# Altium integrated library Integrated_Library - 02.02.25 - 22.49.IntLib: 792 symbols (part 6 of 11) (continued)
## CMP-009-00188-1
designator R?, comment ERJ-2GEJ681X  value 680  Mounting Technology: Surface Mount  Min Operating Temperature: -55°C  Case/Package: 0402  Tolerance: 5%  Pins: 2  Packaging: Tape and Reel  Power: 100mW  Max Operating Temperature: 155°C  RoHS Compliant: Yes
Fixed Resistor, Metal Glaze/thick Film, 0.1W, 680ohm, 50V, 5% +/-Tol, 200ppm/Cel, Surface Mount, 0402; Package Length: 1mm; Temperature Coefficient (ppm/Cel): 200; Reference Standard: AEC-Q200; Package Height: 0.35mm; Rated Temperature: 70°C; Package Width: 0.5mm; Terminal Finish: Nickel; Resistor Type: FIXED RESISTOR; Working Voltage: 50V; Construction: Rectangular; Termination: Wraparound; JESD-609 Code: e3; Package Shape: Rectangular; Reach SVHC Compliant: Yes; Technology: METAL GLAZE/THICK FILM
footprint RESC0805(2012)_L (Chip Resistor, Body 2.0x1.3mm, IPC High Density)
footprint RESC1005X40X25LL05T05 (Chip Resistor, 2-Leads, Body 1.00x0.50mm, IPC High Density)
footprint RESC1005X40X25NL05T05 (Chip Resistor, 2-Leads, Body 1.00x0.50mm, IPC Medium Density)
footprint RESC1005X40X25ML05T05 (Chip Resistor, 2-Leads, Body 1.00x0.50mm, IPC Low Density)
pins: 1, 2
1 alternate drawing of the same symbol

## CMP-009-00189-1
designator R?, comment ERJ-2RKF1002X  value 10k  Power: 100mW  Max Operating Temperature: 155°C  RoHS Compliant: Yes  Case/Package: 0402  Tolerance: 1%  Pins: 2  Packaging: Tape and Reel  Mounting Technology: Surface Mount  Min Operating Temperature: -55°C
Fixed Resistor, Metal Glaze/thick Film, 0.1W, 10000ohm, 50V, 1% +/-Tol, 100ppm/Cel, Surface Mount, 0402; Rated Temperature: 70°C; Reference Standard: AEC-Q200; Package Height: 0.35mm; Temperature Coefficient (ppm/Cel): 100; Package Width: 0.5mm; Package Length: 1mm; Resistor Type: FIXED RESISTOR; Terminal Finish: Nickel; Termination: Wraparound; JESD-609 Code: e3; Package Shape: Rectangular; Working Voltage: 50V; Technology: METAL GLAZE/THICK FILM; Construction: Rectangular; Reach SVHC Compliant: Yes
footprint RESC0805(2012)_L (Chip Resistor, Body 2.0x1.3mm, IPC High Density)
footprint RESC1005X40X25ML05T05-6 (Chip Resistor, 2-Leads, Body 1.05x0.55mm, IPC Low Density)
footprint RESC1005X40X25LL05T05-7 (Chip Resistor, 2-Leads, Body 1.05x0.55mm, IPC High Density)
footprint RESC1005X40X25NL05T05-8 (Chip Resistor, 2-Leads, Body 1.05x0.55mm, IPC Medium Density)
pins: 1, 2
1 alternate drawing of the same symbol

## CMP-009-00190-2
designator R?, comment ERJ-1GN0R00C  value 0  Case/Package: 0201  Min Operating Temperature: -55°C  RoHS Compliant: Yes  Mounting Technology: Surface Mount  Voltage Rating: 25V  Max Operating Temperature: 125°C  Tolerance: 1%
Zero Ohm Resistor, Jumper, 0201 [0603 Metric], Thick Film, 50 mW, 500 mA, Surface Mount; Case Code (Imperial): 0201; Contact Plating: Tin; Case Code (Metric): 0603
footprint FP-ERJ1GN-IPC_B
pins: 1, 2

## CMP-009-00191-1
designator R?, comment ERJ-2GEJ512X  value 5.1k  Packaging: Tape and Reel  Tolerance: 5%  Pins: 2  Mounting Technology: Surface Mount  Power: 100mW  Min Operating Temperature: -55°C  RoHS Compliant: Yes  Max Operating Temperature: 155°C  Case/Package: 0402
Fixed Resistor, Metal Glaze/thick Film, 0.1W, 5100ohm, 50V, 5% +/-Tol, 200ppm/Cel, Surface Mount, 0402; Reference Standard: AEC-Q200; Rated Temperature: 70°C; Temperature Coefficient (ppm/Cel): 200; Package Width: 0.5mm; Package Length: 1mm; Package Height: 0.35mm; Technology: METAL GLAZE/THICK FILM; Resistor Type: FIXED RESISTOR; Working Voltage: 50V; Package Shape: Rectangular; Construction: Rectangular; JESD-609 Code: e3; Terminal Finish: Nickel; Termination: Wraparound; Reach SVHC Compliant: Yes
footprint RESC0805(2012)_L (Chip Resistor, Body 2.0x1.3mm, IPC High Density)
footprint RESC1005X40X25LL05T05-34 (Chip Resistor, 2-Leads, Body 1.00x0.50mm, IPC High Density)
footprint RESC1005X40X25NL05T05-36 (Chip Resistor, 2-Leads, Body 1.00x0.50mm, IPC Medium Density)
footprint RESC1005X40X25ML05T05-35 (Chip Resistor, 2-Leads, Body 1.00x0.50mm, IPC Low Density)
pins: 1, 2
1 alternate drawing of the same symbol

## CMP-009-00192-1
designator R?, comment ERJ-2GEJ101X  value 100  Min Operating Temperature: -55°C  Packaging: Tape and Reel  Case/Package: 0402  Tolerance: 5%  Mounting Technology: Surface Mount  Max Operating Temperature: 155°C  Pins: 2  Power: 100mW  RoHS Compliant: Yes
Fixed Resistor, Metal Glaze/thick Film, 0.1W, 100ohm, 50V, 5% +/-Tol, 200ppm/Cel, Surface Mount, 0402; Package Width: 0.5mm; Rated Temperature: 70°C; Package Height: 0.35mm; Temperature Coefficient (ppm/Cel): 200; Package Length: 1mm; Reference Standard: AEC-Q200; JESD-609 Code: e3; Working Voltage: 50V; Technology: METAL GLAZE/THICK FILM; Construction: Rectangular; Terminal Finish: Nickel; Resistor Type: FIXED RESISTOR; Termination: Wraparound; Package Shape: Rectangular; Reach SVHC Compliant: Yes
footprint RESC0805(2012)_L (Chip Resistor, Body 2.0x1.3mm, IPC High Density)
footprint RESC1005X40X25LL05T05-18 (Chip Resistor, 2-Leads, Body 1.00x0.50mm, IPC High Density)
footprint RESC1005X40X25ML05T05-19 (Chip Resistor, 2-Leads, Body 1.00x0.50mm, IPC Low Density)
footprint RESC1005X40X25NL05T05-20 (Chip Resistor, 2-Leads, Body 1.00x0.50mm, IPC Medium Density)
pins: 1, 2
1 alternate drawing of the same symbol

## CMP-009-00193-1
designator R?, comment ERA-2AEB103X  value 10k  Packaging: Tape and Reel  Power: 63mW  Min Operating Temperature: -55°C  Mounting Technology: Surface Mount  Case/Package: 0402  Tolerance: 0.1%  Pins: 2  RoHS Compliant: Yes  Max Operating Temperature: 155°C
Fixed Resistor, Thin Film, 0.063W, 10000ohm, 50V, 0.1% +/-Tol, 25ppm/Cel, Surface Mount, 0402; Working Voltage: 25V; Reference Standard: AEC-Q200; Package Height: 0.35mm; Package Length: 1mm; Rated Temperature: 85°C; Temperature Coefficient (ppm/Cel): 25; Package Width: 0.5mm; Construction: Rectangular; Technology: THIN FILM; Reach SVHC Compliant: Yes; Termination: Wraparound; JESD-609 Code: e3; Resistor Type: FIXED RESISTOR; Terminal Finish: Nickel
footprint RESC0805(2012)_L (Chip Resistor, Body 2.0x1.3mm, IPC High Density)
footprint FP-ERA2A-IPC_C
footprint FP-ERA2A-IPC_B
footprint FP-ERA2A-IPC_A
footprint FP-ERA2A-MFG
pins: 1, 2
1 alternate drawing of the same symbol

## CMP-009-00194-1
designator R?, comment RC0402FR-0717K8L  value 17.8k  Packaging: Tape and Reel  Mounting Technology: Surface Mount  Pins: 2  Power: 62.5mW  Min Operating Temperature: -55°C  RoHS Compliant: Yes  Case/Package: 0402  Max Operating Temperature: 155°C  Tolerance: 1%
Fixed Resistor, Metal Glaze/thick Film, 0.0625W, 17800ohm, 50V, 1% +/-Tol, 100ppm/Cel, Surface Mount, 0402; Temperature Coefficient (ppm/Cel): 100; Rated Temperature: 70°C; Package Width: 0.5mm; Package Height: 0.35mm; Additional Feature: LASER TRIMMABLE; Package Length: 1mm; Terminal Finish: Nickel; Resistor Type: FIXED RESISTOR; Package Shape: Rectangular; Technology: METAL GLAZE/THICK FILM; Working Voltage: 50V; Termination: Wraparound; Construction: Chip; JESD-609 Code: e3; Reach SVHC Compliant: Yes
footprint RESC0805(2012)_L (Chip Resistor, Body 2.0x1.3mm, IPC High Density)
footprint RESC1005X40X25LL05T10-14 (Chip Resistor, 2-Leads, Body 1.00x0.50mm, IPC High Density)
footprint RESC1005X40X25ML05T10-15 (Chip Resistor, 2-Leads, Body 1.00x0.50mm, IPC Low Density)
footprint RESC1005X40X25NL05T10-16 (Chip Resistor, 2-Leads, Body 1.00x0.50mm, IPC Medium Density)
pins: 1, 2
1 alternate drawing of the same symbol

## CMP-009-00195-1
designator R?, comment ERJ-3EKF6800V  value 680  Max Operating Temperature: 155°C  RoHS Compliant: Yes  Packaging: Tape and Reel  Case/Package: 0603  Tolerance: 1%  Min Operating Temperature: -55°C  Pins: 2  Mounting Technology: Surface Mount  Power: 100mW
Fixed Resistor, Metal Glaze/thick Film, 0.1W, 680ohm, 75V, 1% +/-Tol, 100ppm/Cel, Surface Mount, 0603; Temperature Coefficient (ppm/Cel): 100; Reference Standard: AEC-Q200; Package Length: 1.6mm; Package Width: 0.8mm; Rated Temperature: 70°C; Package Height: 0.45mm; Resistor Type: FIXED RESISTOR; JESD-609 Code: e3; Technology: METAL GLAZE/THICK FILM; Construction: Rectangular; Reach SVHC Compliant: Yes; Terminal Finish: Nickel; Package Shape: Rectangular; Termination: Wraparound; Working Voltage: 75V
footprint RESC0805(2012)_L (Chip Resistor, Body 2.0x1.3mm, IPC High Density)
footprint FP-ERJ3EK-MFG
footprint FP-ERJ3EK-IPC_A
footprint FP-ERJ3EK-IPC_B
footprint FP-ERJ3EK-IPC_C
pins: 1, 2
1 alternate drawing of the same symbol

## CMP-009-00196-1
designator R?, comment ERJ-2GEJ270X  value 27  Case/Package: 0402  Min Operating Temperature: -55°C  RoHS Compliant: Yes  Mounting Technology: Surface Mount  Pins: 2  Power: 100mW  Tolerance: 5%  Max Operating Temperature: 155°C
Fixed Resistor, Metal Glaze/thick Film, 0.1W, 27ohm, 50V, 5% +/-Tol, 200ppm/Cel, Surface Mount, 0402
footprint RESC0805(2012)_L (Chip Resistor, Body 2.0x1.3mm, IPC High Density)
footprint RESC1005X40X25LL05T05-34 (Chip Resistor, 2-Leads, Body 1.00x0.50mm, IPC High Density)
footprint RESC1005X40X25ML05T05-35 (Chip Resistor, 2-Leads, Body 1.00x0.50mm, IPC Low Density)
footprint RESC1005X40X25NL05T05-36 (Chip Resistor, 2-Leads, Body 1.00x0.50mm, IPC Medium Density)
pins: 1, 2
1 alternate drawing of the same symbol

## CMP-010-000000-2
designator J?, comment DISP_SD_DB
[UNFINISHED FP] 1.8in TFT COLOR SCREEN WITH SD CARD; Source: Display_Module.SchLib; Design Item ID: DISP_SD_DB
footprint DISP_SD_DB-Footprint-1
pins: 1 VCC (power), 2 GND (power), 3 GND (power), 4 NC, 5 NC, 6 NC, 7 CLK (io), 8 SDA (io), 9 RS (io), 10 RST (io), 11 CS (io), 12 SD_CS (io), 13 SD_MOSI (io), 14 SD_SCK (io), 15 SD_MISO (io)

## CMP-010-00000-3
designator U?, comment ADXL335BCPZ
Small, Low Power, 3-Axis +/-3 g Accelerometer with Analog Output, 1.6 KHz BW, Industrial, 16-Pin QFN, Tray; Manufacturer: Analog Devices; Min Supply Voltage: 1.8V; Package Version: 051909-A, 05/2009; Max Supply Voltage: 3.6V; Sensor Type: Motion; Nominal Supply Current: 350µA; Package Description: 16-Pin Lead Frame Chip Scale Package, 4 x 4 mm Body, 0.65 mm Pitch; Min Operating Temperature: -40°C; Case/Package: PDIP; Datasheet Version: Rev. B, 01/2010; Package Quantity: 490; Package Reference: CP-16-14; Mounting Technology: SM; Packaging: Tray; Datasheet URL: http://www.analog.com/static/imported-files/data_sheets/ADXL335.pdf; Pins: 16; Max Operating Temperature: 85°C; RoHS Compliant: True
footprint ADI-CP-16-14_N (QFN, 16-Leads, Body 4.15x4.15mm, Pitch 0.65mm, Thermal Pad 2.4x2.4mm, IPC Medium Density)
footprint ADI-CP-16-14_M (QFN, 16-Leads, Body 4.15x4.15mm, Pitch 0.65mm, Thermal Pad 2.4x2.4mm, IPC Low Density)
footprint ADI-CP-16-14_L (QFN, 16-Leads, Body 4.15x4.15mm, Pitch 0.65mm, Thermal Pad 2.4x2.4mm, IPC High Density)
part A pins: 2 ST (in) "Self-Test.", 3 COM (power) "Common.", 5 COM (power) "Common.", 6 COM (power) "Common.", 7 COM (power) "Common.", 8 ZOUT (out) "Z Channel Output.", 10 YOUT (out) "Y Channel Output.", 12 XOUT (out) "X Channel Output.", 14 VS (power) "Supply Voltage (1.8 V to 3.6 V).", 15 VS (power) "Supply Voltage (1.8 V to 3.6 V).", 17 EP "Not internally connected. Solder for mechanical integrity."
part B pins: 1 NC "No Connect.", 4 NC "No Connect.", 9 NC "No Connect.", 11 NC "No Connect.", 13 NC "No Connect.", 16 NC "No Connect."

## CMP-010-000001-2
designator U?, comment B39162B2611P810
1.58247GHz Frequency GPS RF SAW Filter (Surface Acoustic Wave) 0.9dB 46.8MHz Bandwidth 5-SMD, No Lead; Design Item ID: B39162B2611P810; Source: Display_Module.SchLib
footprint B39162B2611P810-Footprint-1
pins: 1 IN (in), 2 OUT (out), 3 GND (power), 4 GND (power), 5 GND (power)

## CMP-010-00001-3
designator U?, comment ADXL345BCCZ-RL
3-Axis, +/-2 g / +/-4 g / +/-8 g / +/-16 g Digital Accelerometer with Digital Output, 1.6 KHz BW, -40 to 85 degC, 14-Pin LGA, Reel; Manufacturer: Analog Devices; Max Supply Voltage: 3.6V; Interface: Serial; Sensor Type: Motion; Nominal Supply Voltage: 2.5V; Min Supply Voltage: 2V; Nominal Supply Current: 140µA; Package Version: 03-16-2010-A, 03/2010; RoHS Compliant: True; Packaging: TapeandReel; Max Operating Temperature: 85°C; Min Operating Temperature: -40°C; Package Description: 14-Pin Land Grid Array, 3 x 5 mm Body, 0.8 mm Pitch; Datasheet Version: Rev. E, 06/2015; Case/Package: LGA; Pins: 14; Mounting Technology: SM; Package Quantity: 5000; Package Reference: CC-14-1; Datasheet URL: http://www.analog.com/static/imported-files/data_sheets/ADXL345.pdf
footprint ADI-CC-14-1_V (LGA, 14-Leads, Body 5x3mm, Pitch 0.8mm)
pins: 1 VDD I/O (power) "Digital Interface Supply Voltage.", 2 GND (power) "This pin must be connected to ground.", 3 RESERVED "Reserved. This pin must be connected to VS or left open.", 4 GND (power) "This pin must be connected to ground.", 5 GND (power) "This pin must be connected to ground.", 6 VS (power) "Supply Voltage.", 7 ~{CS} (in) "Chip Select.", 8 INT1 (out) "Interrupt 1 Output.", 9 INT2 (out) "Interrupt 2 Output.", 10 NC "Not Internally Connected.", 11 RESERVED "Reserved. This pin must be connected to ground or left open.", 12 SDO/ALT ADDRESS (io) "Serial Data Output (SPI 4-Wire)/Alternate I2C Address Select (I2C).", 13 SDA/SDI/SDIO (io) "Serial Data (I2C)/Serial Data Input (SPI 4-Wire)/Serial Data Input and Output (SPI 3-Wire).", 14 SCL/SCLK (in) "Serial Communications Clock. SCL is the clock for I2C, and SCLK is the clock for SPI."

## CMP-010-00002-3
designator U?, comment MCP9700T-E/TT
Low-Power Linear Active Thermistor(TM) IC, 2.3 to 5.5 V, -40 to 125degC, 3-Pin SOT-23, RoHS, Tape and Reel; Manufacturer: Microchip; Min Supply Voltage (DC): 3V; Max Supply Voltage (DC): 5V; Max Ouput Current: 100A; Sensor Type: Temperature; Interface: Serial; Output Voltage: 500mV; Min Supply Voltage: 2.3V; Output Current: 100µA; Mounting Technology: SM; Datasheet URL: http://ww1.microchip.com/downloads/en/DeviceDoc/21942e.pdf; Package Reference: SOT23-3; Max Supply Voltage: 5V; Package Description: 3-Pin Small Outline Transistor, Body 2.9 x 1.3 mm, Pitch 0.95 mm; Packaging: TapeandReel; Case/Package: TO-236-3; Pins: 3; Max Operating Temperature: 125°C; Min Operating Temperature: -40°C; Package Quantity: 3000; RoHS Compliant: True; Datasheet Version: Rev. E, 04/2009
footprint MCHP-SOT23-3_M (SOT23, 3-Leads, Body 3.05x1.4mm, Pitch 0.95mm, IPC Low Density)
footprint MCHP-SOT23-3_L (SOT23, 3-Leads, Body 3.05x1.4mm, Pitch 0.95mm, IPC High Density)
pins: 1 VDD (power), 2 VOUT (power), 3 GND (power)

## CMP-010-00003-3
designator U?, comment MCP9808-E/MS
+/- 0.5 degC Maximum Accuracy Digital Temperature Sensor, 2.7 to 5.5 V, -40 to 125 degC, 8-Pin MSOP, Pb-Free, Tube; Manufacturer: Microchip; Min Supply Voltage (DC): 7V; Min Supply Voltage: 2.7V; Max Supply Voltage (DC): 5V; Output Current: 200µA; Interface: I2C; Case/Package: MSOP; Pins: 8; Max Operating Temperature: 125°C; Datasheet URL: http://ww1.microchip.com/downloads/en/DeviceDoc/25095A.pdf; Packaging: Tray; Package Reference: MSOP-MS8; Package Description: 8-Pin Plastic Micro Small Outline Package, Body 3 x 3 mm, Pitch 0.65 mm; Mounting Technology: SM; RoHS Compliant: True; Package Quantity: 100; Min Operating Temperature: -40°C; Sensor Type: Temperature; Max Supply Voltage: 5V; Datasheet Version: Rev. A, 10/2011
footprint MCHP-MSOP-MS8_N (SOP, 8-Leads, Body 3x3mm, Pitch 0.65mm, IPC Medium Density)
footprint MCHP-MSOP-MS8_L (SOP, 8-Leads, Body 3x3mm, Pitch 0.65mm, IPC High Density)
footprint MCHP-MSOP-MS8_M (SOP, 8-Leads, Body 3x3mm, Pitch 0.65mm, IPC Low Density)
pins: 1 SDA (io) "Serial Data Line", 2 SCL (in) "Serial Clock Line", 3 ALERT (oc) "Temperature Alert Output", 4 GND (power) "Ground", 5 A2 (in) "Slave Address", 6 A1 (in) "Slave Address", 7 A0 (in) "Slave Address", 8 VDD (power) "Power Pin"

## CMP-010-00004-3
designator U?, comment TMP36GT9Z
Low Voltage Temperature Sensor, 2.7 to 5.5 V, -55 to 150 degC, 3-pin TO-92 (T-3), Tray; Manufacturer: Analog Devices; Nominal Supply Voltage: 3.3V; Interface: Serial; Package Version: 042208-A, 04/2008; Max Supply Voltage: 5.5V; Min Supply Voltage: 2.7V; Datasheet Version: Rev. H, 05/2015; Mounting Technology: TH; RoHS Compliant: True; Package Reference: T-3; Min Operating Temperature: -40°C; Package Description: 3-Pin Plastic Header-Style Package [TO-92]; Sensor Type: Temperature; Packaging: Tray; Max Operating Temperature: 150°C; Package Quantity: 100; Pins: 3; Case/Package: TO-226-3; Datasheet URL: http://www.analog.com/static/imported-files/data_sheets/TMP35_36_37.pdf
footprint ADI-T-3 (TO, 3-Leads, Dia 5.2mm)
pins: 1 +VS (power), 2 VOUT (out), 3 GND (power)

## CMP-010-00005-3
designator U?, comment HPP845E031R4
Digital Relative Humidity Sensor with Temperature Output, 1.5 to 3.6 V, -40 to 125 degC, 6-Pin SON, RoHS, Tape and Reel; Manufacturer: TE Connectivity; Max Supply Voltage: 3.6V; Min Supply Voltage: 1.5V; RoHS Compliant: False; Datasheet Version: Sep-15; Package Description: 6-Pin Small Outline No-lead Package, Body 3 x 3 mm, Pitch 1 mm; Datasheet URL: http://www.te.com/commerce/DocumentDelivery/DDEController?Action=srchrtrv&DocNm=HPC199_6&DocType=Data+Sheet&DocLang=English; Case/Package: SON-6; Package Reference: SON-6; Sensor Type: Humidity; Mounting Technology: SM
footprint TECO-SON-6_V (SON, 6-Leads, Body 3x3mm, Pitch 1mm, Thermal Pad 2.4x1.5mm)
pins: 1 DATA (io) "Data bit-stream", 2 GND (power) "Ground", 3 NC "Must be left unconnected", 4 NC "Must be left unconnected", 5 VDD (power) "Supply Voltage", 6 SCK (in) "Selector for RH or Temp", 7 PAD (power) "Ground or unconnected"

## CMP-010-00006-3
designator U?, comment MPU-9250
9-axis MotionTracking device, 2.4 to 3,6 V, -40 to 85 degC, 24-Pin QFN, RoHS, Tape and Reel; Manufacturer: InvenSense; Sensor Type: Motion; Max Supply Voltage: 3.6V; Min Supply Voltage: 2.4V; Package Description: 24-Pin Quad Flat No-lead Package, Body 3 x 3 mm, Pitch 0.4 mm; RoHS Compliant: True; Datasheet Version: Rev. 1.0, 01/2014; Pins: 24; Mounting Technology: SM; Datasheet URL: http://datasheet.octopart.com/MPU-9250-InvenSense-datasheet-21859386.pdf; Package Quantity: 5000; Package Reference: QFN-24; Case/Package: Module
footprint INSE-QFN-24-1700X1540TP_L (QFN, 24-Leads, Body 3.1x3.1mm, Pitch 0.40mm, Thermal Pad 1.54x1.70mm, IPC High Density)
footprint INSE-QFN-24-1700X1540TP_M (QFN, 24-Leads, Body 3.1x3.1mm, Pitch 0.40mm, Thermal Pad 1.54x1.70mm, IPC Low Density)
footprint INSE-QFN-24-1700X1540TP_N (QFN, 24-Leads, Body 3.1x3.1mm, Pitch 0.40mm, Thermal Pad 1.54x1.70mm, IPC Medium Density)
part A pins: 1 RESV (power) "Reserved. Connect to VDDIO", 7 AUX_CL (out) "I2C Master serial clock, for connecting to external sensors", 8 VDDIO (power) "Digital I/O supply voltage", 9 AD0/SDO (io) "I2C Slave Address LSB (AD0); SPI serial data output (SDO)", 10 REGOUT "Regulator filter capacitor connection", 11 FSYNC (in) "Frame synchronization digital input. Connect to GND if unused", 12 INT (hiz) "Interrupt digital output (totem pole or open-drain)", 13 VDD (power) "Power supply voltage and Digital I/O supply voltage", 18 GND (power) "Pow er supply ground", 19 RESV "Reserved. Do not connect", 20 RESV (power) "Reserved. Connect to GND", 21 AUX_DA (io) "I2C master serial data, for connecting to external sensors", 22 nCS (in) "Chip select (SPI mode only)", 23 SCL/SCLK (in) "I2C serial clock (SCL); SPI serial clock (SCLK)", 24 SDA/SDI (io) "I2C serial data (SDA); SPI serial data input (SDI)", 25 EP
part B pins: 2 NC "Not internally connected. May be used for PCB trace routing", 3 NC "Not internally connected. May be used for PCB trace routing", 4 NC "Not internally connected. May be used for PCB trace routing", 5 NC "Not internally connected. May be used for PCB trace routing", 6 NC "Not internally connected. May be used for PCB trace routing", 14 NC "Not internally connected. May be used for PCB trace routing", 15 NC "Not internally connected. May be used for PCB trace routing", 16 NC "Not internally connected. May be used for PCB trace routing", 17 NC "Not internally connected. May be used for PCB trace routing"

## CMP-010-00007-3
designator U?, comment A1324LLHLT-T
Low Noise, Linear Hall Effect Sensor IC with Analog Output, 4.5 to 5.5 V, -40 to 150 degC, 3-Pin SOT23, RoHS, Tape and Reel; Manufacturer: Allegro Microsystems; Nominal Supply Voltage: 5V; Max Supply Voltage: 5.5V; Min Supply Voltage: 4.5V; Package Quantity: 3000; Packaging: TapeandReel; Pins: 3; Case/Package: SOT23W-3; Min Operating Temperature: -40°C; Datasheet URL: http://www.allegromicro.com/en/Products/Part_Numbers/1324/1324.pdf; Max Operating Temperature: 150°C; Package Description: 3-Pin Small Outline Transistor, Body 3 x 1.975 mm, Pitch 0.95 mm; Datasheet Version: Rev. 4, 09/2013; Package Reference: SOT23W-3; Mounting Technology: SM; Sensor Type: Hall; RoHS Compliant: True
footprint ALEG-SOT23W-3_V (SOT23, 3-Leads, Body 3.1x2.1mm, Pitch 0.95mm)
pins: 1 VCC (power) "Input power supply; tie to GND with  bypass capacitor", 2 VOUT (out) "Output signal; also used for  programming", 3 GND (power) "Ground"

## CMP-010-00008-3
designator U?, comment A1324LUA-T
Low Noise, Linear Hall Effect Sensor IC with Analog Output, 4.5 to 5.5 V, -40 to 150 degC, 3-Pin SIP (UA), RoHS, Bulk; Manufacturer: Allegro Microsystems; Max Supply Voltage: 5.5V; Output Current: 10mA; Nominal Supply Voltage: 5V; Min Supply Voltage: 4.5V; Package Description: 3-Pin Single In-line Package, Body 4.105 x 1.52 mm, Pitch 1.27 mm; Mounting Technology: TH; Package Reference: UA3; Case/Package: SIP; RoHS Compliant: True; Datasheet Version: Rev. 4, 09/2013; Max Operating Temperature: 150°C; Package Quantity: 4000; Datasheet URL: http://www.allegromicro.com/en/Products/Part_Numbers/1324/1324.pdf; Sensor Type: Hall; Pins: 3; Min Operating Temperature: -40°C; Packaging: Bulk
footprint ALEG-UA-3 (SIP, 3-Leads, Body 4.2x1.6mm, Pitch 1.27 mm)
pins: 1 VCC (power) "Input power supply; tie to GND with  bypass capacitor", 2 GND (power) "Ground", 3 VOUT (out) "Output signal; also used for  programming"

## CMP-010-00009-3
designator U?, comment HTU21D
Digital Relative Humidity Sensor with Temperature Output, 1.5 to 3.6 V, -40 to 125 degC, 6-Pin SON, RoHS, Tape and Reel; Manufacturer: Measurement Specialties; Min Supply Voltage: 1.5V; Interface: Serial; Max Supply Voltage: 3.6V; Nominal Supply Voltage: 3V; Max Operating Temperature: 125°C; Case/Package: DFN; RoHS Compliant: True; Pins: 6; Sensor Type: Humidity; Package Description: 6-Pin Small Outline No-Lead, Body 3 x 3 mm, Pitch 1 mm, Thermal Pad 2.4 x 1.5 mm; Min Operating Temperature: -40°C; Mounting Technology: SM; Datasheet URL: https://datasheet.ciiva.com/28624/1792510-28624306.pdf; Package Reference: SON-6; Packaging: TapeandReel; Datasheet Version: Rev. 2, 07/2013
footprint MEAS-SON-6_V (SON, 6-Leads, Body 3x3mm, Pitch 1mm, Thermal Pad 2.4x1.5mm)
pins: 1 DATA (io) "Data bit-stream", 2 GND (power) "Ground", 3 NC "Must be left unconnected", 4 NC "Must be left unconnected", 5 VDD (power) "Supply Voltage", 6 SCK (in) "Selector for RH or Temp", 7 EP (power) "Ground or unconnected"

## CMP-010-00010-3
designator U?, comment ITG-3200
Single-Chip, Digital-Output, MEMS Gyroscope, 2.1 to 3.6 V, -40 to 105 degC, 24 -Pin QFN, RoHS, Tape and Reel; Manufacturer: InvenSense; Interface: Serial; Min Supply Voltage: 2.1V; Max Supply Voltage: 3.6V; Min Operating Temperature: -40°C; Datasheet URL: http://www.farnell.com/datasheets/887152.pdf; Datasheet Version: Rev. 1.4, 03/2010; Packaging: CutTape; Pins: 24; Package Description: 24-Pin Quad Flat No-lead Package, Body 4.00 x 4.00 mm, Pitch 0.50 mm, Thermal Pad 3.00 x 2.80 mm; RoHS Compliant: True; Max Operating Temperature: 85°C; Package Reference: QFN-24_A; Case/Package: QFN; Mounting Technology: SM
footprint INSE-QFN-24_A_M (QFN, 24-Leads, Body 4.1x4.1mm, Pitch 0.50mm, Thermal Pad 3.00x2.80mm, IPC Low Density)
footprint INSE-QFN-24_A_L (QFN, 24-Leads, Body 4.1x4.1mm, Pitch 0.50mm, Thermal Pad 3.00x2.80mm, IPC High Density)
footprint INSE-QFN-24_A_N (QFN, 24-Leads, Body 4.1x4.1mm, Pitch 0.50mm, Thermal Pad 3.00x2.80mm, IPC Medium Density)
part A pins: 1 CLKIN (in) "Optional external reference clock input. Connect to GND if unused.", 8 VLOGIC (power) "Digital IO supply voltage. VLOGIC must be =< VDD at all times.", 9 AD0 (in) "I2C Slave Address LSB", 10 REGOUT "Regulator filter capacitor connection", 12 INT (oc) "Interrupt digital output (totem pole or open-drain)", 13 VDD (power) "Power supply voltage", 18 GND (power) "Power supply ground", 20 CPOUT "Charge pump capacitor connection", 23 SCL (in) "I2C serial clock", 24 SDA (io) "I2C serial data"
part B pins: 2 NC "Not internally connected. May be used for PCB trace routing.", 3 NC "Not internally connected. May be used for PCB trace routing.", 4 NC "Not internally connected. May be used for PCB trace routing.", 5 NC "Not internally connected. May be used for PCB trace routing.", 6 RESV "Reserved. Do not connect.", 7 RESV "Reserved. Do not connect.", 11 RESV-G "Reserved - Connect to ground", 14 NC "Not internally connected. May be used for PCB trace routing.", 15 NC "Not internally connected. May be used for PCB trace routing.", 16 NC "Not internally connected. May be used for PCB trace routing.", 17 NC "Not internally connected. May be used for PCB trace routing.", 19 RESV "Reserved. Do not connect.", 21 RESV "Reserved. Do not connect.", 22 RESV "Reserved. Do not connect.", 25 EP

## CMP-010-00011-3
designator U?, comment L3GD20H
MEMS Motion Sensor: Three-Axis Digital Output Gyroscope, 2.2 to 3.6 V, -40 to 85 degC, 16-Pin LGA, RoHS, Tray; Manufacturer: STMicroelectronics; Max Supply Voltage: 3.6V; Min Supply Voltage: 2.2V; Pins: 16; Datasheet Version: Rev. 2, 03/2013; Package Description: 16-Pin Land Grid Array Package, Body 3 x 3 mm, Pitch 0.5 mm; RoHS Compliant: True; Case/Package: LGA; Packaging: CutTape; Datasheet URL: http://www.st.com/content/ccc/resource/technical/document/datasheet/35/b1/e0/39/71/57/43/01/DM00060659.pdf/files/DM00060659.pdf/jcr:content/translations/en.DM00060659.pdf; Sensor Type: Motion; Mounting Technology: SM; Package Reference: LGA-16
footprint STM-LGA-16_N (LGA, 16-Leads, Body 3.15x3.15mm, Pitch 0.5mm, IPC Medium Density)
footprint STM-LGA-16_M (LGA, 16-Leads, Body 3.15x3.15mm, Pitch 0.5mm, IPC Low Density)
footprint STM-LGA-16_L (LGA, 16-Leads, Body 3.15x3.15mm, Pitch 0.5mm, IPC High Density)
pins: 1 VDD_IO (power) "Power supply for I/O pins", 2 SCL/SPC (in), 3 SDA/SDI/SDO (io), 4 SDO/SA0 (io), 5 CS (in) "I2C/SPI mode selection (1: SPI idle mode / I2C communication enabled; 0: SPI communication mode / I2C disabled)", 6 DRDY/INT2 (out), 7 INT1 (out) "Programmable interrupt", 8 DEN (in) "Gyroscope data enable", 9 RES "Connect to GND", 10 RES "Connect to GND", 11 RES "Connect to GND or VDD", 12 GND (power) "0 V supply", 13 GND (power) "0 V supply", 14 CAP "Connect to GND with ceramic capacitor", 15 RES "Connect to GND or VDD", 16 VDD (power) "Power supply"

## CMP-010-00012-3
designator U?, comment MMA8452QR1
3-Axis, 12-Bit / 8-Bit Digital Acceleromete, 1.95 to 3.6 V, -40 to 85 degC, 16-Pin QFN, RoHS, Tape and Reel; Manufacturer: Freescale; Min Supply Voltage: 1.95V; Sensor Type: Motion; Interface: I2C; Max Supply Voltage: 3.6V; Nominal Supply Voltage: 2.5V; Datasheet Version: Rev. 10, 04/2016; Max Operating Temperature: 85°C; Package Quantity: 1000; Package Reference: QFN-16; Datasheet URL: http://cache.nxp.com/files/sensors/doc/data_sheet/MMA8452Q.pdf; Packaging: TapeandReel; Case/Package: QFN; Mounting Technology: SM; Pins: 16; RoHS Compliant: True; Min Operating Temperature: -40°C; Package Description: 16-Pin Quad Flat No-lead Package, Body 3 x 3 mm , Pitch 0.5 mm
footprint FREE-QFN-16_V (QFN, 16-Leads, Body 3x3mm, Pitch 0.5mm)
pins: 1 VDDIO (power) "Internal power supply (1.62 V to 3.6 V)", 2 BYP "Bypass capacitor (0.1 uF)", 3 DNC "Do not connect to anything, leave pin isolated and floating.", 4 SCL (in) "I2C serial clock, open drain", 5 GND (power) "Connect to ground", 6 SDA "I2C serial data", 7 SA0 (in) "I2C least significant bit of the device I2C address, I2C 7-bit address = 0x1C (SA0 = 0), 0x1D (SA0 = 1).", 8 NC "Internally not connected", 9 INT2 (out) "Inertial interrupt 2, output pin", 10 GND (power) "Connect to ground", 11 INT1 (out) "Inertial interrupt 1, output pin", 12 GND (power) "Connect to ground", 13 NC "Internally not connected", 14 VDD (power) "Power supply (1.95 V to 3.6 V)", 15 NC "Internally not connected", 16 NC "Internally not connected (can be GND or VDD)"

## CMP-010-00013-3
designator U?, comment MPL3115A2
I2C Precision Pressure Sensor with Altimetry, 1.95 to 3.6 V, -40 to 85 degC, 8-Pin LGA, RoHS, Tray; Manufacturer: Freescale Semiconductor; Max Supply Voltage: 3.6V; Nominal Supply Current: 2µA; Nominal Supply Voltage: 2.5V; Output Voltage: 3.9V; Min Supply Voltage: 1.95V; Datasheet Version: Rev. 4.0, 09/2015; Pins: 8; Package Reference: 2153-01; Max Operating Temperature: 85°C; Case/Package: LGA; Min Operating Temperature: -40°C; RoHS Compliant: True; Sensor Type: Pressure; Package Quantity: 490; Datasheet URL: http://cache.freescale.com/files/sensors/doc/data_sheet/MPL3115A2.pdf; Packaging: Tray
footprint FRES-2153-01_V (LGA, 8-Leads, Body 5x3mm, Pitch 1.25mm)
pins: 1 VDD (power) "VDD Power Supply Connection (1.95-3.6 V)", 2 CAP "External Capacitor", 3 GND (power) "Ground", 4 VDDIO (power) "Digital Interface Power Supply (1.62-3.6 V)", 5 INT2 (out) "Pressure Interrupt 2", 6 INT1 (out) "Pressure Interrupt 1", 7 SDA (io) "I2C Serial Data", 8 SCL (in) "I2C Serial Data"

## CMP-010-00014-3
designator U?, comment MPU6050
3-Axis Gyroscope, 3-Axis Accelerometer, 2.375 to 3.46 V, -40 to 105 degC, 24-Pin QFN, RoHS, Tape and Reel; Manufacturer: InvenSense; Max Supply Voltage: 3.6V; Min Supply Voltage: 2.5V; Sensor Type: Motion; Interface: I2C; Min Operating Temperature: -40°C; Case/Package: QFN; Package Quantity: 5000; Pins: 24; RoHS Compliant: True; Packaging: CutTape; Datasheet URL: https://datasheet.ciiva.com/1513/1788002-1513632.pdf; Package Reference: QFN-24; Datasheet Version: Rev. 3.4, 08/2013; Package Description: 24-Pin Quad Flat No-lead Package, Body 4 x 4 mm, Pitch 0.5 mm; Max Operating Temperature: 85°C; Mounting Technology: SM
footprint INSE-QFN-24_V (QFN, 24-Leads, Body 4.00x4.00mm, Pitch 0.50mm, Thermal Pad 2.7x2.6mm)
part A pins: 1 CLKIN (in) "Optional external reference clock input. Connect to GND if unused.", 6 AUX_DA (io) "I2C master serial data, for connecting to external sensors", 7 AUX_CL (out) "I2C Master serial clock, for connecting to external sensors", 8 VLOGIC (power) "Digital I/O supply voltage", 9 AD0 (in) "I2C Slave Address LSB (AD0)", 10 REGOUT "Regulator filter capacitor connection", 11 FSYNC (in) "Frame synchronization digital input. Connect to GND if unused.", 12 INT (oc) "Interrupt digital output (totem pole or open-drain)", 13 VDD (power) "Power supply voltage and Digital I/O supply voltage", 18 GND (power) "Power supply ground", 19 RESV "Reserved. Do not connect.", 20 CPOUT (out) "Charge pump capacitor connection", 21 RESV "Reserved. Do not connect.", 22 RESV "Reserved. Do not connect.", 23 SCL (in) "I2C serial clock (SCL)", 24 SDA (io) "I2C serial data (SDA)", 25 EP
part B pins: 2 NC "Not internally connected. May be used for PCB trace routing.", 3 NC "Not internally connected. May be used for PCB trace routing.", 4 NC "Not internally connected. May be used for PCB trace routing.", 5 NC "Not internally connected. May be used for PCB trace routing.", 14 NC "Not internally connected. May be used for PCB trace routing.", 15 NC "Not internally connected. May be used for PCB trace routing.", 16 NC "Not internally connected. May be used for PCB trace routing.", 17 NC "Not internally connected. May be used for PCB trace routing."

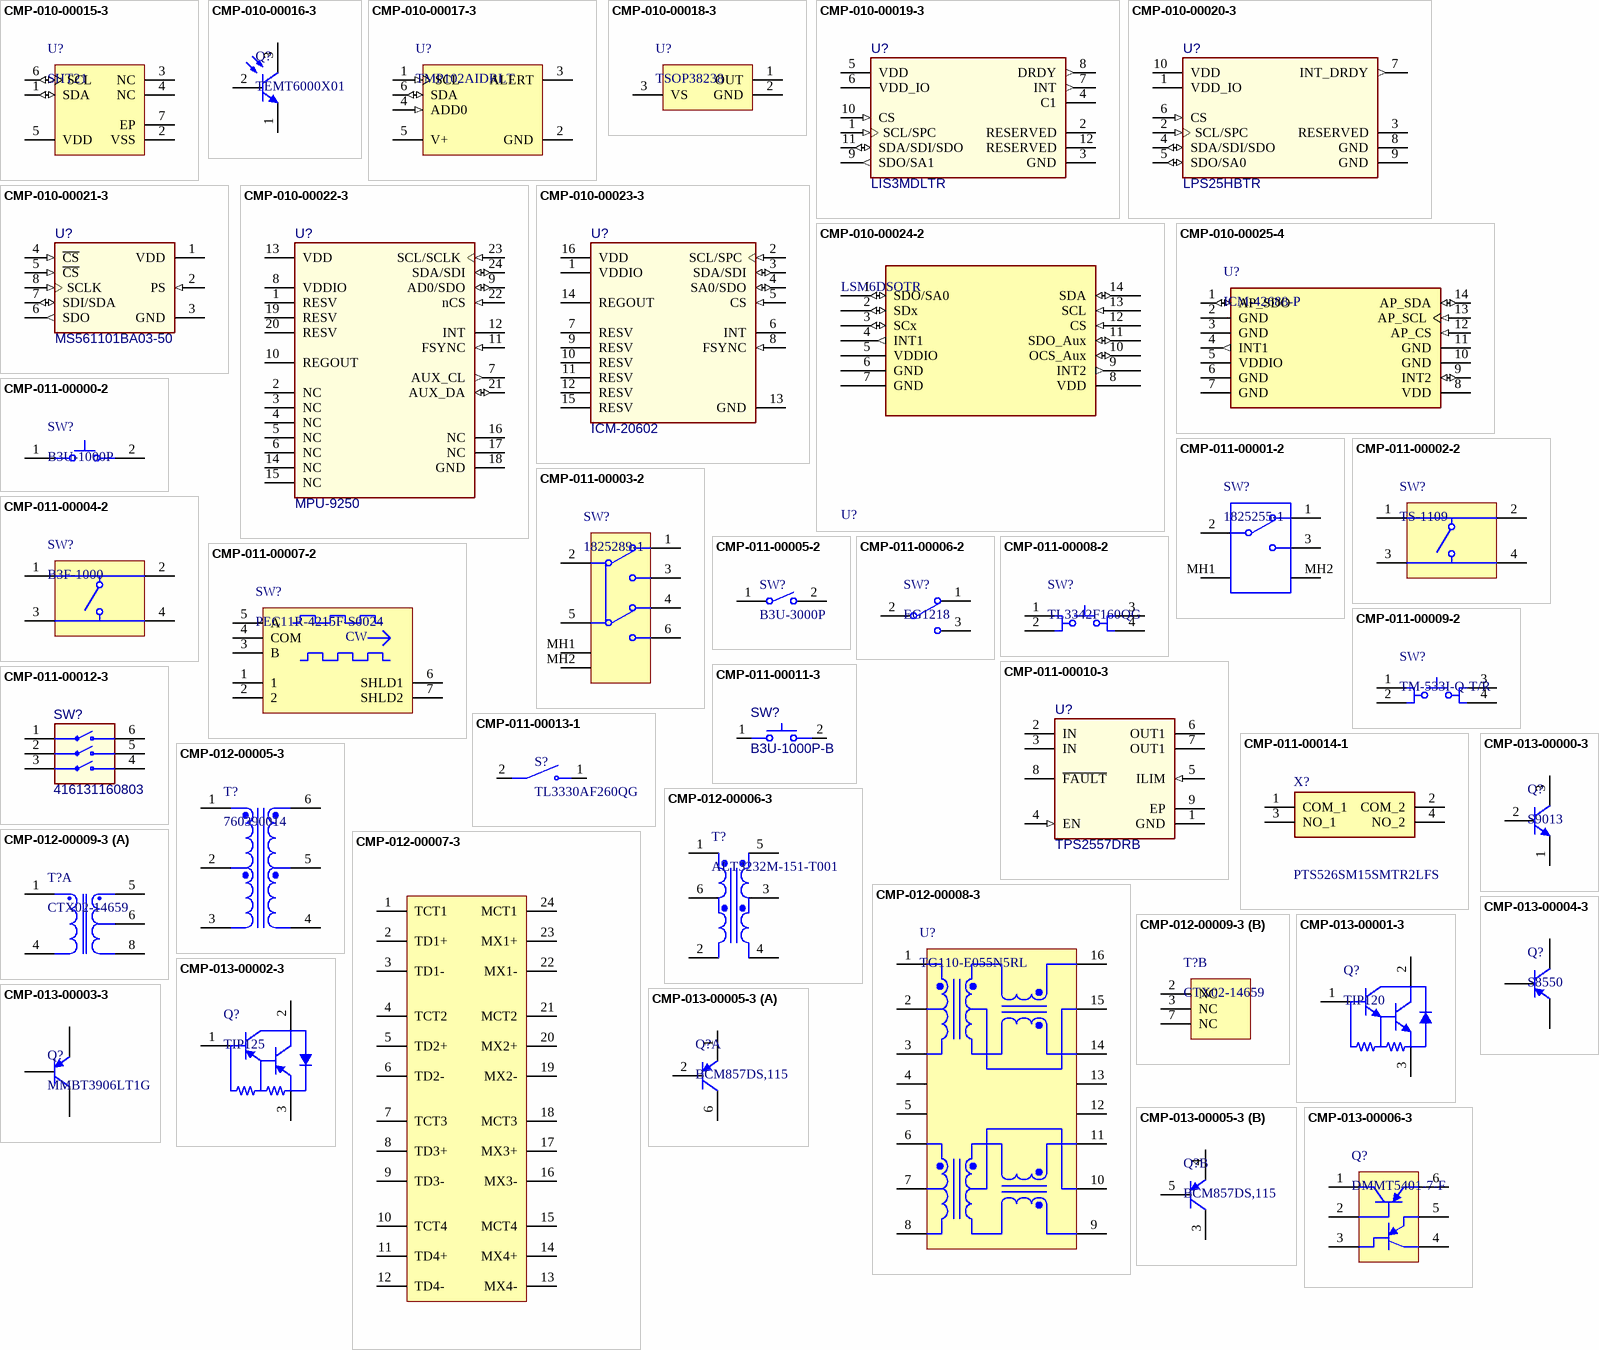
[diagram p15: symbols CMP-010-00015-3 to CMP-013-00006-3]

## CMP-010-00015-3
designator U?, comment SHT21
Humidity and Temperature Sensor, 2.1 to 3.6 V, -40 to 125 degC, 6-Pin DFN, RoHS, Tape and Reel; Manufacturer: Sensirion; Min Supply Voltage: 2.1V; Nominal Supply Voltage: 3V; Max Supply Voltage: 3.6V; Interface: Serial; Mounting Technology: SM; Datasheet URL: https://www.sensirion.com/fileadmin/user_upload/customers/sensirion/Dokumente/2_Humidity_Sensors/Sensirion_Humidity_Sensors_SHT21_Datasheet_V4.pdf; Datasheet Version: Rev. 4, 05/2014; Pins: 6; RoHS Compliant: True; Packaging: CutTape; Max Operating Temperature: 125°C; Min Operating Temperature: -40°C; Case/Package: DFN; Sensor Type: HumidityandTemperature; Package Description: 6-Pin Smal Outline Non-lead, Body 3 x 3 mm, Pitch 1 mm
footprint SENS-SON-6_V (SON, 6-Leads, Body 3x3mm, Pitch 1mm, Thermal Pad 2.4x1.5mm)
pins: 1 SDA (io) "Serial Data, bidirectional", 2 VSS (power) "Ground", 3 NC "Not Connected", 4 NC "Not Connected", 5 VDD (power) "Supply Voltage", 6 SCL (io) "Serial Clock, bidirectional", 7 EP (power) "The die pad (center pad) is internally connected to VSS"

## CMP-010-00016-3
designator Q?, comment TEMT6000X01
Ambient Light Sensor, 100 mW, -40 to 100 degC, 3-Pin SMD, RoHS, Tape and Reel; Manufacturer: Vishay Siliconix; Datasheet Version: Rev. 1.9, 08/2011; Package Reference: 1206; RoHS Compliant: Unknown; Case/Package: 1206; Datasheet URL: http://www.vishay.com/docs/81579/temt6000.pdf; Package Description: 3-Pin Surface Mount Device, Body 4 x 2 mm; Sensor Type: Light; Mounting Technology: SM
footprint VSIL-TEMT6000X01_V (SMD, 3-Leads, Body 4x2mm)
pins: 1 E, 2 B, 3 C

## CMP-010-00017-3
designator U?, comment TMP102AIDRLT
Low Power Digital Temperature Sensor with SMBus and Two-Wire Serial Interface, 1.4 to 3.6 V, -40 to 125 degC, 6-Pin SOT (DRL), Green (RoHS & no Sb/Br), Tape and Reel; Manufacturer: Texas Instruments; Package Version: 4205622-3/D, 08/2207; Output Current: 3mA; Max Supply Voltage: 3.3V; Min Supply Voltage (DC): 4V; Interface: I2C; Min Supply Voltage: 1.4V; Max Supply Voltage (DC): 6V; Datasheet URL: http://www.ti.com/lit/ds/symlink/tmp102.pdf; RoHS Compliant: True; Sensor Type: Temperature; Mounting Technology: SM; Package Description: 6-Pin Plastic Small Outline, Body 1.6 x 1.2 mm, Pitch 0.5 mm; Datasheet Version: SBOS397F, 12/2015; Package Quantity: 1; Min Operating Temperature: -55°C; Pins: 6; Max Operating Temperature: 150°C; Package Reference: DRL0006A; Case/Package: SOT-553-6; Packaging: CutTape
footprint DRL0006A_N (SOT23, 6-Leads, Body 1.7x1.3mm, Pitch 0.5mm, IPC Medium Density)
footprint DRL0006A_M (SOT23, 6-Leads, Body 1.7x1.3mm, Pitch 0.5mm, IPC Low Density)
footprint DRL0006A_L (SOT23, 6-Leads, Body 1.7x1.3mm, Pitch 0.5mm, IPC High Density)
pins: 1 SCL (in) "Serial clock. Open-drain output; requires a pullup resistor.", 2 GND (power) "Ground", 3 ALERT (oc) "Overtemperature alert. Open-drain output; requires a pullup resistor.", 4 ADD0 (in) "Address select. Connect to GND or V+", 5 V+ (power) "Supply voltage, 1.4 V to 3.6 V", 6 SDA (io) "Serial data. Open-drain output; requires a pullup resistor."

## CMP-010-00018-3
designator U?, comment TSOP38238
IR Receiver Modules for Remote Control System, 2.5 to 5.5 V, -25 to 85 degC, 3-Pin THD, RoHS, Bulk; Manufacturer: Vishay Semiconductor; Nominal Supply Current: 3mA; Max Supply Voltage: 5.5V; Sensor Type: Optical; Min Supply Voltage: 2.5V; Output Current: 5mA; Datasheet Version: Rev. 1.5, 07/2016; Package Reference: TSOP38238; Mounting Technology: TH; Package Description: 3-Pin Through Hole Device, Body 5.00 x 4.80 mm, Pitch 2.54 mm; Max Operating Temperature: 85°C; Package Quantity: 1500; RoHS Compliant: True; Case/Package: Axial; Min Operating Temperature: -25°C; Pins: 3; Packaging: Bulk; Datasheet URL: http://www.vishay.com/docs/82491/tsop382.pdf
footprint VISH-TSOP38238 (TH, 3-Leads, Body 5.00x4.80mm, Pitch 2.54mm)
pins: 1 OUT (power), 2 GND (power), 3 VS (power)

## CMP-010-00019-3
designator U?, comment LIS3MDLTR
Digital Output Magnetic Sensor, 1.9 to 3.6 V, -40 to 85 degC, 12-Pin LGA, RoHS, Tape and Reel; Max Supply Voltage: 3.6V; Min Supply Voltage: 1.9V; Sensor Type: Magnetometer; Min Operating Temperature: -40°C; RoHS Compliant: Yes; Mounting Technology: SMT; Case/Package: LGA-12; Max Operating Temperature: 85°C; Pins: 12
footprint STM-LGA-12 (LGA, 12-Leads, Body 2x2mm, Pitch 0.5mm)
footprint STM-LGA-12 (LGA, 12-Leads, Body 2x2mm, Pitch 0.5mm)
pins: 1 SCL/SPC (in), 2 RESERVED "Connect to GND", 3 GND (power) "Connect to GND", 4 C1 "Capacitor connection (C1=100 nF)", 5 VDD (power) "Power supply", 6 VDD_IO (power) "Power supply for I/O pins", 7 INT (out) "Interrupt", 8 DRDY (out) "Data Ready", 9 SDO/SA1 (out), 10 CS (in) "SPI enable,I2C/SPI mode selection,(1: SPI idle mode / I2C communication enabled;0: SPI communication mode / I2C disabled)", 11 SDA/SDI/SDO (io), 12 RESERVED "Connect to GND"

## CMP-010-00020-3
designator U?, comment LPS25HBTR
MEMS Pressure Sensor, 1.7 to 3.6 V, -30 to 105 degC, 10-Pin LGA, RoHS, Tray; Min Supply Voltage: 1.7V; Sensor Type: Barometer; Max Supply Voltage: 3.6V; Mounting Technology: SMT; Case/Package: LGA-10; Max Operating Temperature: 105°C; RoHS Compliant: Yes; Pins: 10; Min Operating Temperature: -30°C
footprint STM-LGA-10 (LGA, 10-Leads, Body 2.5x2.5mm, Pitch 0.6mm)
footprint STM-LGA-10 (LGA, 10-Leads, Body 2.5x2.5mm, Pitch 0.6mm)
pins: 1 VDD_IO (power) "Power supply for I/O pins", 2 SCL/SPC (in), 3 RESERVED "Connect to GND", 4 SDA/SDI/SDO (io), 5 SDO/SA0 (io), 6 CS (in), 7 INT_DRDY (out) "Interrupt or Data Ready", 8 GND (power) "0 V supply", 9 GND (power) "0 V supply", 10 VDD (power) "Power supply"

## CMP-010-00021-3
designator U?, comment MS561101BA03-50
Barometric Pressure Sensor, 1.8 to 3.6 V, -40 to 85 degC, 8-Pin SMD, RoHS, Tape and Reel; Min Supply Voltage: 1.8V; Max Supply Voltage: 3.6V; Sensor Type: Barometer; Pins: 8; RoHS Compliant: Yes; Mounting Technology: SMT; Case/Package: LGA-8; Min Operating Temperature: -40°C; Max Operating Temperature: 85°C
footprint TECO-MS561101BA03_V (SMD, 8-Leads, Body 3x5mm, Pitch 1.25mm)
footprint TECO-MS561101BA03_V (SMD, 8-Leads, Body 3x5mm, Pitch 1.25mm)
pins: 1 VDD (power) "Positive supply voltage", 2 PS (in) "Protocol select. PS high (VDD) ---> I2C. PS low (GND) ---> SPI", 3 GND (power) "Ground", 4 ~{CS} (in) "Chip select (active low), internal connection", 5 ~{CS} (in) "Chip select (active low), internal connection", 6 SDO (out) "Serial data output", 7 SDI/SDA (io) "Serial data input / I2C data IO", 8 SCLK (in) "Serial data clock"